# Altium footprint library connectors_headers.PcbLib: 60 footprints (part 1 of 4)
Each footprint in its own frame and in the unit in brackets; x right, y up, seen from the top. Pads: shape width x height; smd on the part's side, far side on the other; paste and mask are expansions set on the pad; w line width, h text height; cw(c..) or ccw(c..) is an arc to the next point about the centre after c.
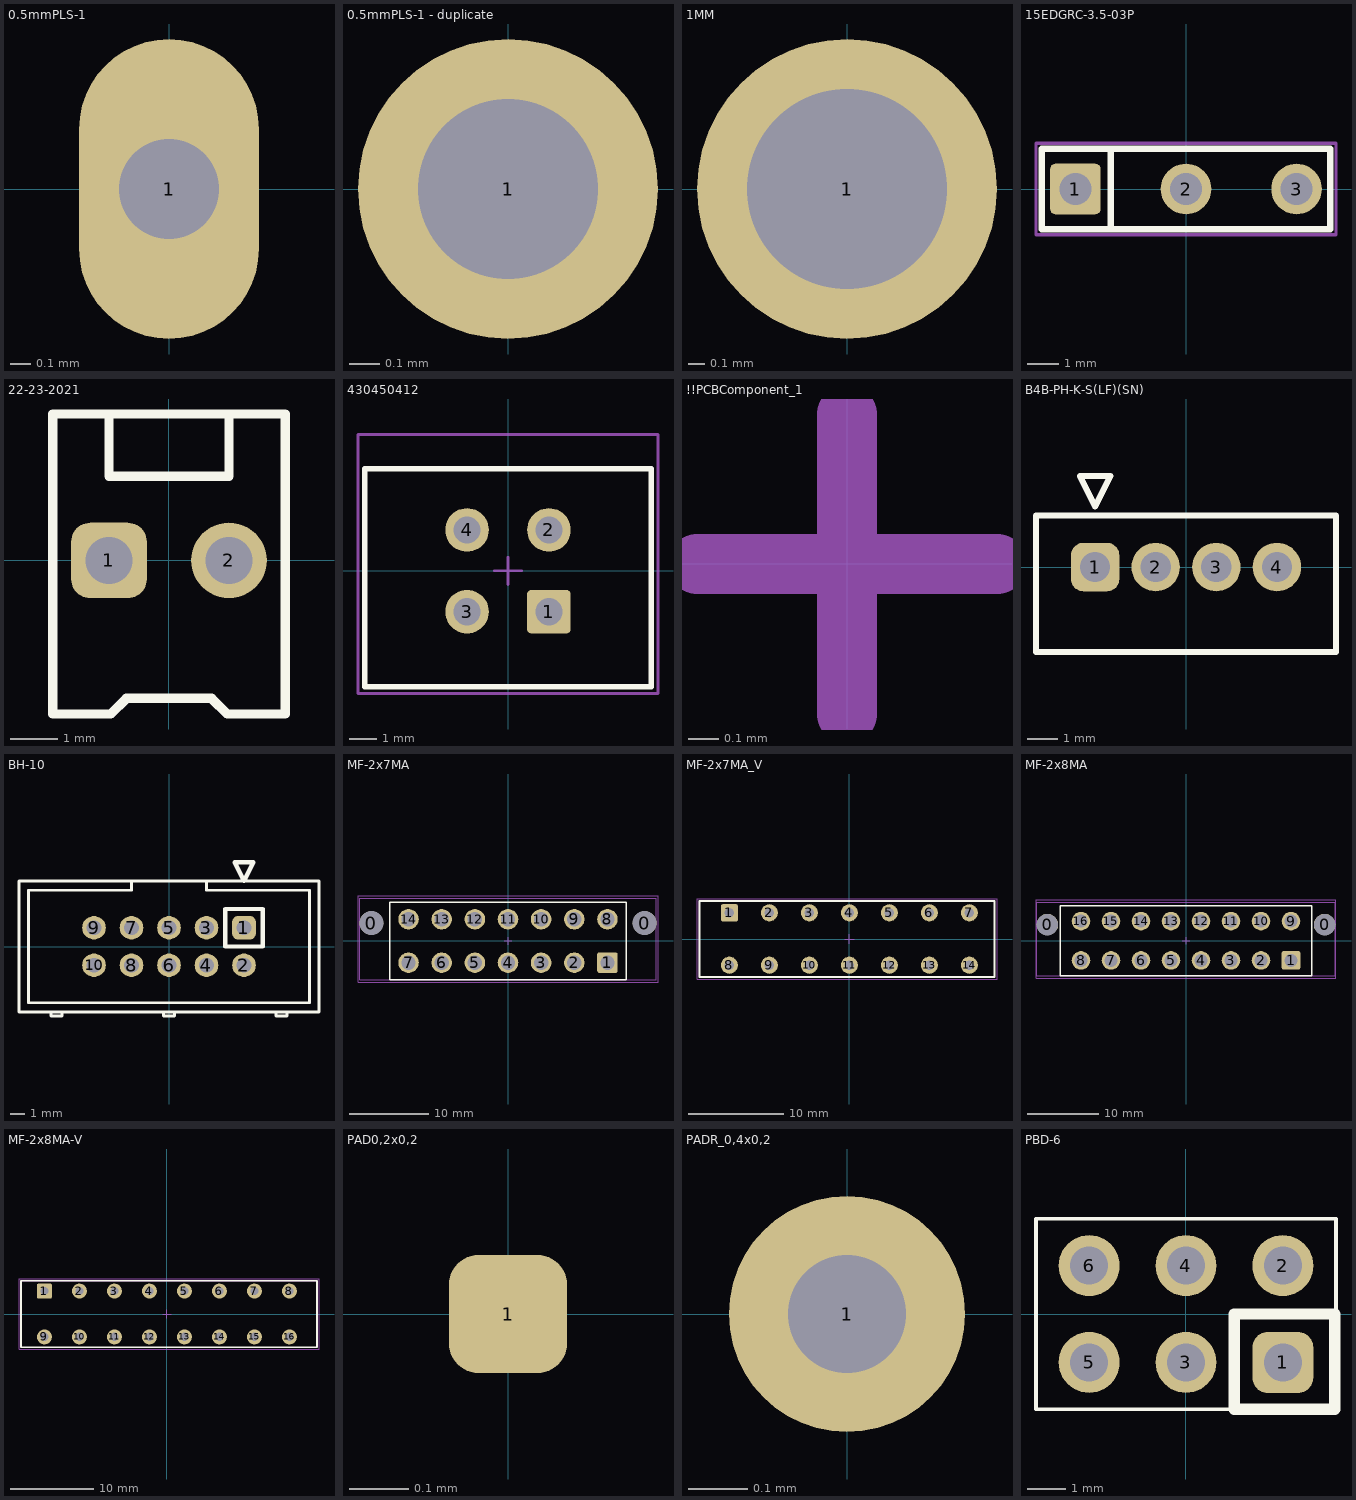
[diagram p0: the footprints below, top view; thin cyan lines are the x and y axes]

## 0.5mmPLS-1 [mm]
height 0.025
pads (1):
  oval 0.9x1.5 / inner oval 0.9x1.5 / far side round 0.9 hole 0.5: 1(0,0)
3D body: height 1, standoff -5, extent -0.198,-0.199 0.2,0.2

## 0.5mmPLS-1 - duplicate [mm]
height 0.025
pads (1):
  round 1 hole 0.6: 1(0,0)
3D body: height 1, standoff -5, extent -0.248,-0.249 0.25,0.25

## 1MM [mm]
height 0.025
pads (1):
  round 1.8 hole 1.2: 1(0,0)
3D body: height 2, standoff -10, extent -0.496,-0.499 0.5,0.499

## 15EDGRC-3.5-03P [mm] "3.5-03P"
height 0.025
pads (3):
  rrect20% 1.6x1.6 hole 1: 1(-3.5,0)
  round 1.6 hole 1: 2(0,0) 3(3.5,0)
Top Overlay:
  lines w0.2: -2.385,-1.27 -2.385,1.27 ; -4.57,-1.27 -4.57,1.27 4.57,1.27 4.57,-1.27 -4.57,-1.27
M3_comm_top:
  text ".comment" at -0.9,-0.3 h1
M5_asm_top:
  lines w0.1: -2.385,-1.27 -2.385,1.27 ; -4.57,-1.27 4.57,-1.27 4.57,1.27 -4.57,1.27 -4.57,-1.27
  text ".Designator" at -1.434,1.457 h1
M7_courtyard_top:
  lines w0.1: -0.5,0 0.5,0 ; 0,-0.5 0,0.5 ; -4.75,-1.45 -4.75,1.45 4.75,1.45 4.75,-1.45 -4.75,-1.45
3D body "User Library-15EDGRC-3_5-03P.STEP": height 7.35, standoff -3.25, extent -5.637,-7.987 5.613,1.213

## 22-23-2021 [mm] "Headers & Wire Housings VERT PCB HDR 2P TIN FRICTION LOCK"
height 0.025
pads (2):
  rrect50% 1.6x1.6 hole 1: 1(-1.27,0)
  round 1.6 hole 1: 2(1.27,0)
Top Overlay:
  lines w0.2: -1.27,3.099 -1.27,1.778 1.27,1.778 1.27,3.099 ; -2.464,-3.251 -1.232,-3.251 -0.902,-2.921 0.902,-2.921 1.232,-3.251 2.464,-3.251 2.464,3.099 -2.464,3.099 -2.464,-3.251
3D body "22-23-2021_022232021.stp": height 10.73, standoff -3.49, extent -2.464,-3.251 2.464,3.099

## 430450412 [mm] "CONN HEADER VERT 4POS 3MM"
height 0.025
pads (4):
  rrect20% 1.6x1.6 hole 1 mask+0.127: 1(1.5,-1.5)
  round 1.6 hole 1 mask+0.127: 2(1.5,1.5) 3(-1.5,-1.5) 4(-1.5,1.5)
Top Overlay:
  lines w0.2: -5.25,-4.25 -5.25,3.75 5.25,3.75 5.25,-4.25 -5.25,-4.25
M3_comm_top:
  text ".comment" at -0.9,-0.3 h1
M5_asm_top:
  lines w0.1: -5.25,-4.25 5.25,-4.25 5.25,3.75 -5.25,3.75 -5.25,2.75 -5.25,-4.25
  text ".Designator" at -1.25,5 h1
M7_courtyard_top:
  lines w0.1: -0.5,0 0.5,0 ; 0,-0.5 0,0.5 ; -5.5,-4.5 5.5,-4.5 5.5,5 -5.5,5 -5.5,-4.5
3D body "430450412.stp": height 10.05, standoff -3.04, extent -5.075,-3.97 5.075,4.8

## !!PCBComponent_1 [mm]
M3_comm_top:
  text ".comment" at -0.9,-0.3 h1
M5_asm_top:
  text ".Designator" at -1,1.3 h1
M7_courtyard_top:
  lines w0.2: -0.5,0 0.5,0 ; 0,-0.5 0,0.5

## B4B-PH-K-S(LF)(SN) [mm]
height 0.025
pads (4):
  rrect50% 1.6x1.6 hole 1: 1(-3,0)
  round 1.6 hole 1: 2(-1,0) 3(1,0) 4(3,0)
Top Overlay:
  lines w0.2: -4.95,-2.8 4.95,-2.8 4.95,1.7 -4.95,1.7 -4.95,-2.8 ; -3.5,3 -2.5,3 -3,2 -3.5,3
3D body "B4B-PH-K-S.STEP": height 6, standoff -3.4, extent -4.95,-2.8 4.95,1.7

## BH-10 [mm]
height 0.025
pads (10):
  rrect50% 1.6x1.6 hole 1 mask+0.127: 1(5.08,1.27)
  round 1.6 hole 1 mask+0.127: 2(5.08,-1.27) 3(2.54,1.27) 4(2.54,-1.27) 5(0,1.27) 6(0,-1.27) 7(-2.54,1.27) 8(-2.54,-1.27) 9(-5.08,1.27) 10(-5.08,-1.27)
Top Overlay:
  lines w0.2: -8.001,-4.445 -8.001,-4.699 -7.239,-4.699 -7.239,-4.445 ; -2.54,4.445 -2.54,3.81 -9.525,3.81 -9.525,-3.81 9.525,-3.81 9.525,3.81 2.54,3.81 2.54,4.445 ; -0.381,-4.445 -0.381,-4.699 0.381,-4.699 0.381,-4.445 ; 7.239,-4.445 7.239,-4.699 8.001,-4.699 8.001,-4.445 ; -10.16,-4.445 10.16,-4.445 10.16,4.445 -10.16,4.445 -10.16,-4.445
  lines w0.3: 3.81,0 6.35,0 6.35,2.54 3.81,2.54 3.81,0 ; 4.445,5.715 5.08,4.445 5.715,5.715 4.445,5.715
3D body "BH-10___64.step": height 9.19, standoff -2.95, extent -10.18,-4.755 10.18,4.445

## MF-2x7MA [mm]
height 1.75
pads (16):
  round 3 hole 3 unplated: 0(-17.3,2.27) 0(17.3,2.27)
  rrect20% 2.6x2.6 hole 1.8: 1(12.6,-2.75)
  round 2.6 hole 1.8: 2(8.4,-2.75) 3(4.2,-2.75) 4(0,-2.75) 5(-4.2,-2.75) 6(-8.4,-2.75) 7(-12.6,-2.75) 8(12.6,2.75) 9(8.4,2.75) 10(4.2,2.75) 11(0,2.75) 12(-4.2,2.75) 13(-8.4,2.75) 14(-12.6,2.75)
Top Overlay:
  lines w0.2: -15,-4.9 15,-4.9 15,4.9 -15,4.9 -15,-4.9
M3_comm_top:
  text ".comment" at -0.9,-0.3 h1
M5_asm_top:
  lines w0.1: -18.8,-4.9 18.8,-4.9 18.8,5.4 -18.8,5.4 -18.8,-4.9
  text ".Designator" at -1.25,5.5 h1
M7_courtyard_top:
  lines w0.1: -0.5,0 0.5,0 ; 0,-0.5 0,0.5 ; -19,-5.25 -19,5.75 19,5.75 19,-5.25 -19,-5.25
3D body "MF-2x7MA.SLDPRT": height 14.4, standoff -3.4, extent -18.8,-4.9 18.8,5.4

## MF-2x7MА_V [mm] "Разъем Mini Fit, 14 контактов, шаг 4.2 мм"
height 0.025
pads (14):
  rrect20% 1.8x1.8 hole 1: 1(-12.6,2.75)
  round 1.8 hole 1: 2(-8.4,2.75) 3(-4.2,2.75) 4(0,2.75) 5(4.2,2.75) 6(8.4,2.75) 7(12.6,2.75) 8(-12.6,-2.75) 9(-8.4,-2.75) 10(-4.2,-2.75) 11(0,-2.75) 12(4.2,-2.75) 13(8.4,-2.75) 14(12.6,-2.75)
Top Overlay:
  lines w0.2: -15.75,-4 -15.75,4 15.25,4 15.25,-4 -15.75,-4
M3_comm_top:
  text ".comment" at -0.9,-0.3 h1
M5_asm_top:
  lines w0.1: -15.75,-4 15.25,-4 15.25,4 -15.75,4 -15.75,-4
  text ".Designator" at -1.5,4.25 h1
M7_courtyard_top:
  lines w0.1: -0.5,0 0.5,0 ; 0,-0.5 0,0.5 ; -16,-4.25 15.5,-4.25 15.5,4.25 -16,4.25 -16,-4.25
3D body "4774.stp": height 3.6, standoff -11.4, extent -15.75,-16.685 15.25,3.25

## MF-2x8MA [mm]
height 1.75
pads (18):
  round 3 hole 3 unplated: 0(-19.4,2.27) 0(19.4,2.27)
  rrect20% 2.6x2.6 hole 1.8: 1(14.7,-2.75)
  round 2.6 hole 1.8: 2(10.5,-2.75) 3(6.3,-2.75) 4(2.1,-2.75) 5(-2.1,-2.75) 6(-6.3,-2.75) 7(-10.5,-2.75) 8(-14.7,-2.75) 9(14.7,2.75) 10(10.5,2.75) 11(6.3,2.75) 12(2.1,2.75) 13(-2.1,2.75) 14(-6.3,2.75) 15(-10.5,2.75) 16(-14.7,2.75)
Top Overlay:
  lines w0.2: -17.6,-4.9 17.6,-4.9 17.6,4.9 -17.6,4.9 -17.6,-4.9
M3_comm_top:
  text ".comment" at -0.9,-0.3 h1
M5_asm_top:
  lines w0.1: -20.9,-4.9 20.9,-4.9 20.9,5.4 -20.9,5.4 -20.9,-4.9
  text ".Designator" at -1,5.75 h1
M7_courtyard_top:
  lines w0.1: -0.5,0 0.5,0 ; 0,-0.5 0,0.5 ; -21,-5.25 21,-5.25 21,5.75 -21,5.75 -21,-5.25
3D body "MF-2x8MA.SLDPRT": height 14.4, standoff -3.4, extent -20.9,-4.9 20.9,5.4

## MF-2x8MA-V [mm] "Вилка на плату прямая 4.2мм 16pin"
height 0.025
pads (16):
  rrect20% 1.8x1.8 hole 1: 1(-14.7,2.75)
  round 1.8 hole 1: 2(-10.5,2.75) 3(-6.3,2.75) 4(-2.1,2.75) 5(2.1,2.75) 6(6.3,2.75) 7(10.5,2.75) 8(14.7,2.75) 9(-14.7,-2.75) 10(-10.5,-2.75) 11(-6.3,-2.75) 12(-2.1,-2.75) 13(2.1,-2.75) 14(6.3,-2.75) 15(10.5,-2.75) 16(14.7,-2.75)
Top Overlay:
  lines w0.2: -17.5,-4 18,-4 18,4 -17.5,4 -17.5,-4
M3_comm_top:
  text ".comment" at 0,0 h1
M5_asm_top:
  lines w0.1: -17.5,-4 18,-4 18,4 -17.5,4 -17.5,-4
  text ".Designator" at -0.5,4.25 h1
M7_courtyard_top:
  lines w0.1: -0.5,0 0.5,0 ; 0,-0.5 0,0.5 ; -17.75,-4.25 18.25,-4.25 18.25,4.25 -17.75,4.25 -17.75,-4.25
3D body "39-30-1160.stp": height 11.4, standoff -3.6, extent -17.35,-16.685 17.85,3.25

## PAD0,2x0,2 [mm]
height 0.025
pads (1):
  rrect50% 0.2x0.2 smd mask+0.127: 1(0,0)

## PADR_0,4x0,2 [mm]
height 0.025
pads (1):
  round 0.4 hole 0.2 mask+0.127: 1(0,0)

## PBD-6 [mm]
height 0.025
pads (6):
  rrect50% 1.6x1.6 hole 1 mask+0.127: 1(2.54,-1.27)
  round 1.6 hole 1 mask+0.127: 2(2.54,1.27) 3(0,-1.27) 4(0,1.27) 5(-2.54,-1.27) 6(-2.54,1.27)
Top Overlay:
  lines w0.1: 1.27,-2.5 -3.935,-2.5 -3.935,2.5 3.935,2.5 3.935,0
  lines w0.3: 1.27,-2.5 3.9,-2.5 3.9,0 1.27,0 1.27,-2.5
3D body "PBD-6.stp": height 8.55, standoff -3.15, extent -3.935,-2.5 3.935,2.5